# Altium footprint library 接口库PCB.PcbLib: 76 footprints (part 4 of 5)
Each footprint in its own frame and in the unit in brackets; x right, y up, seen from the top. Pads: shape width x height; smd on the part's side, far side on the other; paste and mask are expansions set on the pad; w line width, h text height; cw(c..) or ccw(c..) is an arc to the next point about the centre after c.
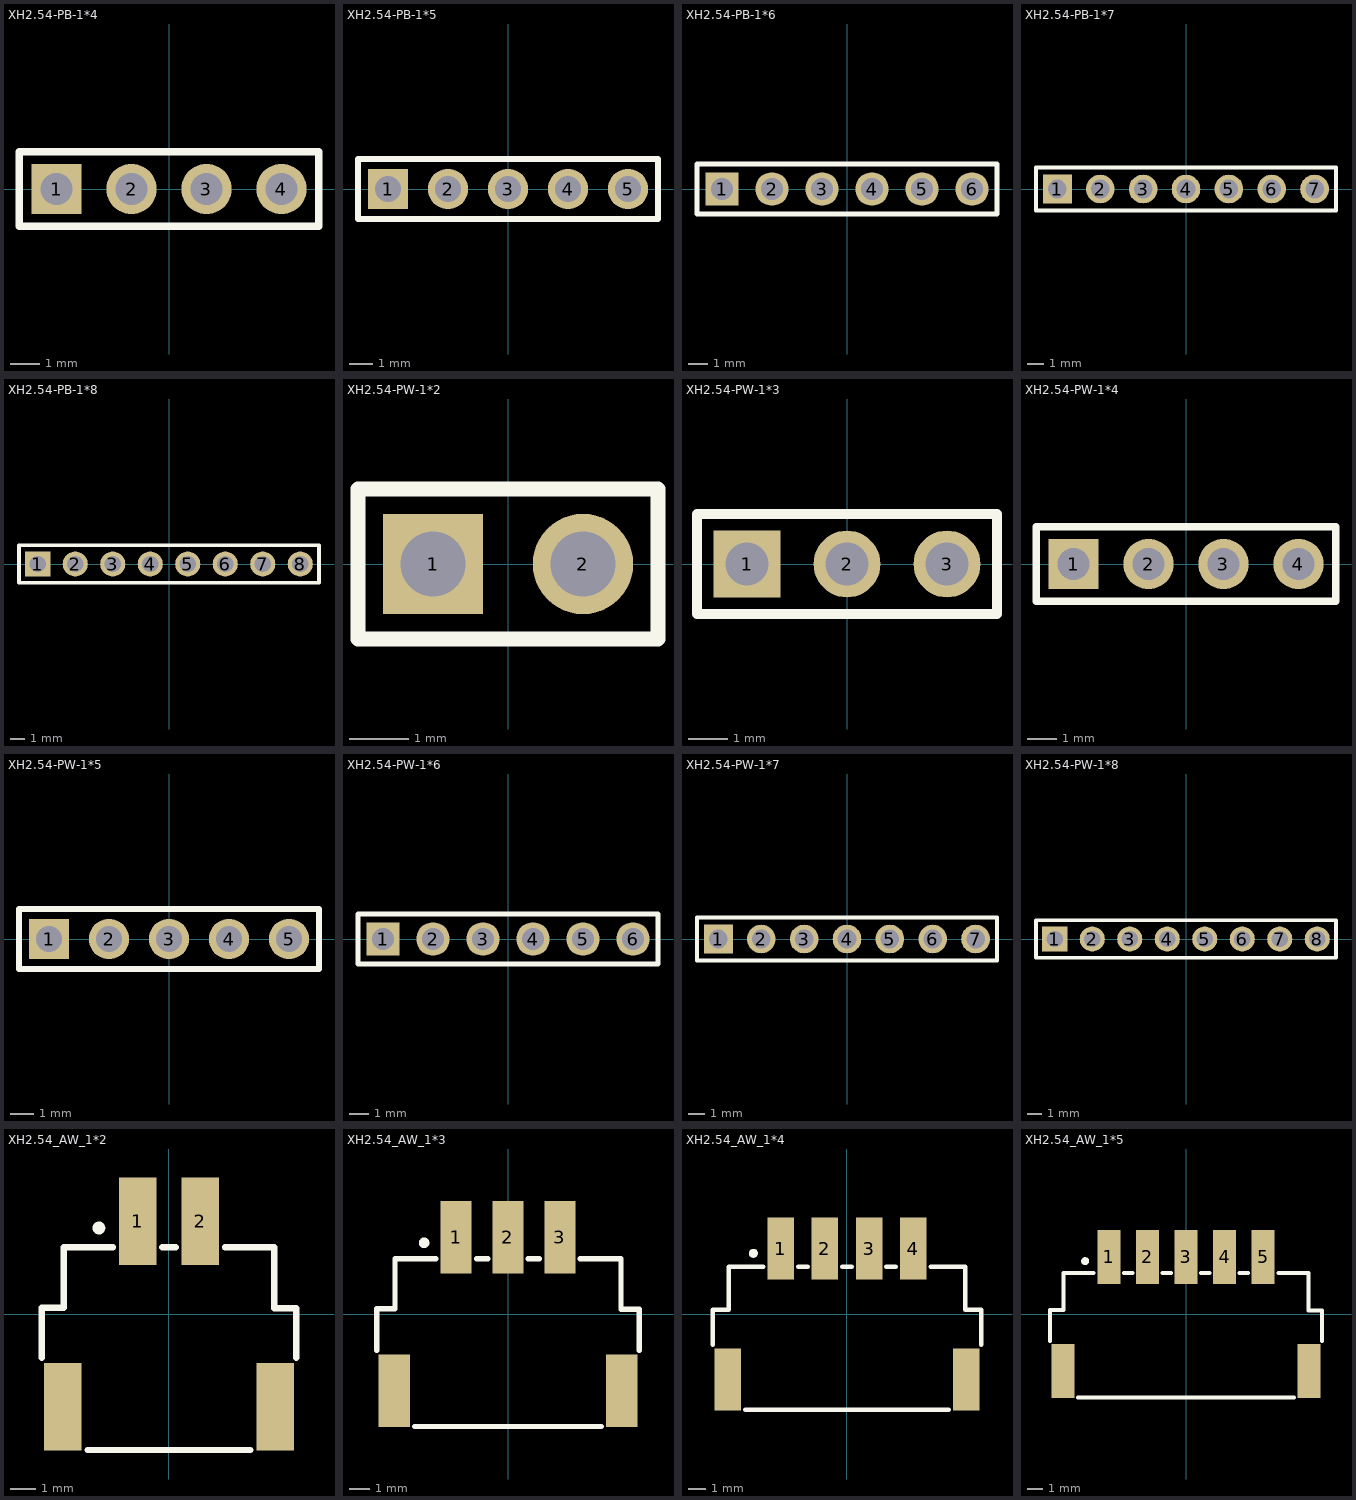
[diagram p3: the footprints below, top view; thin cyan lines are the x and y axes]

## XH2.54-PB-1*4 [mm]
pads (4):
  rect 1.7x1.7 hole 1.1: 1(-3.81,0)
  round 1.7 hole 1.1: 2(-1.27,0) 3(1.27,0) 4(3.81,0)
Top Overlay:
  lines w0.254: -5.08,-1.27 -5.08,1.27 5.08,1.27 5.08,-1.27 -5.08,-1.27
3D body "4P.step": height 7, standoff -3.4, extent -6.18,-2.286 6.18,3.464

## XH2.54-PB-1*5 [mm]
pads (5):
  rect 1.7x1.7 hole 1.1: 1(-5.08,0)
  round 1.7 hole 1.1: 2(-2.54,0) 3(0,0) 4(2.54,0) 5(5.08,0)
Top Overlay:
  lines w0.254: -6.35,-1.27 6.35,-1.27 6.35,1.27 -6.35,1.27 -6.35,-1.27
3D body "5P.step": height 7, standoff -3.4, extent -7.45,-2.286 7.45,3.464

## XH2.54-PB-1*6 [mm]
pads (6):
  rect 1.7x1.7 hole 1.1: 1(-6.35,0)
  round 1.7 hole 1.1: 2(-3.81,0) 3(-1.27,0) 4(1.27,0) 5(3.81,0) 6(6.35,0)
Top Overlay:
  lines w0.254: -7.62,-1.27 -7.62,1.27 7.62,1.27 7.62,-1.27 -7.62,-1.27
3D body "6P.step": height 7, standoff -3.4, extent -8.7,-2.286 8.7,3.464

## XH2.54-PB-1*7 [mm]
pads (7):
  rect 1.7x1.7 hole 1.1: 1(-7.62,0)
  round 1.7 hole 1.1: 2(-5.08,0) 3(-2.54,0) 4(0,0) 5(2.54,0) 6(5.08,0) 7(7.62,0)
Top Overlay:
  lines w0.254: -8.89,-1.27 8.89,-1.27 8.89,1.27 -8.89,1.27 -8.89,-1.27
3D body "70P.step": height 7, standoff -3.4, extent -9.95,-2.286 9.95,3.464

## XH2.54-PB-1*8 [mm]
pads (8):
  rect 1.7x1.7 hole 1.1: 1(-8.89,0)
  round 1.7 hole 1.1: 2(-6.35,0) 3(-3.81,0) 4(-1.27,0) 5(1.27,0) 6(3.81,0) 7(6.35,0) 8(8.89,0)
Top Overlay:
  lines w0.254: -10.16,-1.27 10.16,-1.27 10.16,1.27 -10.16,1.27 -10.16,-1.27
3D body "8P.step": height 7, standoff -3.4, extent -11.2,-2.286 11.2,3.464

## XH2.54-PW-1*2 [mm]
pads (2):
  rect 1.7x1.7 hole 1.1: 1(-1.27,0)
  round 1.7 hole 1.1: 2(1.27,0)
Top Overlay:
  lines w0.254: -2.54,-1.27 -2.54,1.27 2.54,1.27 2.54,-1.27 -2.54,-1.27
3D body "2P.step": height 5.92, standoff -3.24, extent -3.7,-0.408 3.7,7.127

## XH2.54-PW-1*3 [mm]
pads (3):
  rect 1.7x1.7 hole 1.1: 1(-2.54,0)
  round 1.7 hole 1.1: 2(0,0) 3(2.54,0)
Top Overlay:
  lines w0.254: -3.81,-1.27 -3.81,1.27 3.81,1.27 3.81,-1.27 -3.81,-1.27
3D body "3P.step": height 5.92, standoff -3.24, extent -4.95,-0.408 4.95,7.127

## XH2.54-PW-1*4 [mm]
pads (4):
  rect 1.7x1.7 hole 1.1: 1(-3.81,0)
  round 1.7 hole 1.1: 2(-1.27,0) 3(1.27,0) 4(3.81,0)
Top Overlay:
  lines w0.254: -5.08,-1.27 5.08,-1.27 5.08,1.27 -5.08,1.27 -5.08,-1.27
3D body "�ޱ���.step": height 5.92, standoff -3.24, extent -6.2,-0.408 6.2,7.127

## XH2.54-PW-1*5 [mm]
pads (5):
  rect 1.7x1.7 hole 1.1: 1(-5.08,0)
  round 1.7 hole 1.1: 2(-2.54,0) 3(0,0) 4(2.54,0) 5(5.08,0)
Top Overlay:
  lines w0.254: -6.35,-1.27 -6.35,1.27 6.35,1.27 6.35,-1.27 -6.35,-1.27
3D body "5P.step": height 5.92, standoff -3.24, extent -7.45,-0.408 7.45,7.127

## XH2.54-PW-1*6 [mm]
pads (6):
  rect 1.7x1.7 hole 1.1: 1(-6.35,0)
  round 1.7 hole 1.1: 2(-3.81,0) 3(-1.27,0) 4(1.27,0) 5(3.81,0) 6(6.35,0)
Top Overlay:
  lines w0.254: -7.62,-1.27 7.62,-1.27 7.62,1.27 -7.62,1.27 -7.62,-1.27
3D body "6P.step": height 5.92, standoff -3.24, extent -8.7,-0.408 8.7,7.127

## XH2.54-PW-1*7 [mm]
pads (7):
  rect 1.7x1.7 hole 1.1: 1(-7.62,0)
  round 1.7 hole 1.1: 2(-5.08,0) 3(-2.54,0) 4(0,0) 5(2.54,0) 6(5.08,0) 7(7.62,0)
Top Overlay:
  lines w0.254: -8.89,-1.27 8.89,-1.27 8.89,1.27 -8.89,1.27 -8.89,-1.27
3D body "7P.step": height 5.92, standoff -3.24, extent -9.95,-0.408 9.95,7.127

## XH2.54-PW-1*8 [mm]
pads (8):
  rect 1.7x1.7 hole 1.1: 1(-8.89,0)
  round 1.7 hole 1.1: 2(-6.35,0) 3(-3.81,0) 4(-1.27,0) 5(1.27,0) 6(3.81,0) 7(6.35,0) 8(8.89,0)
Top Overlay:
  lines w0.254: -10.16,-1.27 10.16,-1.27 10.16,1.27 -10.16,1.27 -10.16,-1.27
3D body "8P.step": height 5.92, standoff -3.24, extent -11.2,-0.408 11.2,7.127

## XH2.54_AW_1*2 [mm]
pads (4):
  rect 1.5x3.5 smd: 1(-1.25,3.7) 2(1.25,3.7) ""(-4.23,-3.7) ""(4.23,-3.7)
Top Overlay:
  circle w0.254: c-2.794,3.429 r0.127
  lines w0.254: -5.08,-1.742 -5.08,0.254 -4.191,0.254 -4.191,0.857 -4.191,2.064 -4.191,2.667 -2.231,2.667 ; -3.249,-5.42 3.249,-5.42 ; -0.269,2.667 0.269,2.667 ; 2.231,2.667 4.191,2.667 4.191,0.234 5.08,0.234 5.08,-1.742
3D body "XH2.54_AW_2P.step": height 5.97, standoff -0.03, extent -4.725,-5.266 4.725,5.334

## XH2.54_AW_1*3 [mm]
pads (5):
  rect 1.5x3.5 smd: 1(-2.5,3.7) 2(0,3.7) 3(2.5,3.7) ""(-5.48,-3.7) ""(5.48,-3.7)
Top Overlay:
  circle w0.254: c-4.044,3.429 r0.127
  lines w0.254: -6.33,-1.742 -6.33,0.254 -5.441,0.254 -5.441,0.857 -5.441,2.064 -5.441,2.667 -3.481,2.667 ; -4.499,-5.42 4.499,-5.42 ; -1.519,2.667 -0.981,2.667 ; 0.981,2.667 1.519,2.667 ; 3.481,2.667 5.441,2.667 5.441,0.234 6.33,0.234 6.33,-1.742
3D body "XH2.54_AW_3P.step": height 5.97, standoff -0.03, extent -6.022,-5.278 5.928,5.322

## XH2.54_AW_1*4 [mm]
pads (6):
  rect 1.5x3.5 smd: 1(-3.75,3.7) 2(-1.25,3.7) 3(1.25,3.7) 4(3.75,3.7) ""(-6.73,-3.7) ""(6.73,-3.7)
Top Overlay:
  circle w0.254: c-5.294,3.429 r0.127
  lines w0.254: -7.58,-1.742 -7.58,0.254 -6.691,0.254 -6.691,0.857 -6.691,2.064 -6.691,2.667 -4.731,2.667 ; -5.749,-5.42 5.749,-5.42 ; -2.769,2.667 -2.231,2.667 ; -0.269,2.667 0.269,2.667 ; 2.231,2.667 2.769,2.667 ; 4.731,2.667 6.691,2.667 6.691,0.234 7.58,0.234 7.58,-1.742
3D body "XH2.54_AW_4P.step": height 5.97, standoff -0.03, extent -7.225,-5.334 7.225,5.266

## XH2.54_AW_1*5 [mm]
pads (7):
  rect 1.5x3.5 smd: 1(-5,3.7) 2(-2.5,3.7) 3(0,3.7) 4(2.5,3.7) 5(5,3.7) ""(-7.98,-3.7) ""(7.98,-3.7)
Top Overlay:
  circle w0.254: c-6.544,3.429 r0.127
  lines w0.254: -8.83,-1.742 -8.83,0.254 -7.941,0.254 -7.941,0.857 -7.941,2.064 -7.941,2.667 -5.981,2.667 ; -6.999,-5.42 6.999,-5.42 ; -4.019,2.667 -3.481,2.667 ; -1.519,2.667 -0.981,2.667 ; 0.981,2.667 1.519,2.667 ; 3.481,2.667 4.019,2.667 ; 5.981,2.667 7.941,2.667 7.941,0.234 8.83,0.234 8.83,-1.742
3D body "XH2.54_AW_5P.step": height 5.95, standoff -0.05, extent -8.509,-5.3 8.441,5.3